# Altium footprint library Amirreza.PcbLib: 524 footprints (part 21 of 33)
Each footprint in its own frame and in the unit in brackets; x right, y up, seen from the top. Pads: shape width x height; smd on the part's side, far side on the other; paste and mask are expansions set on the pad; w line width, h text height; cw(c..) or ccw(c..) is an arc to the next point about the centre after c.
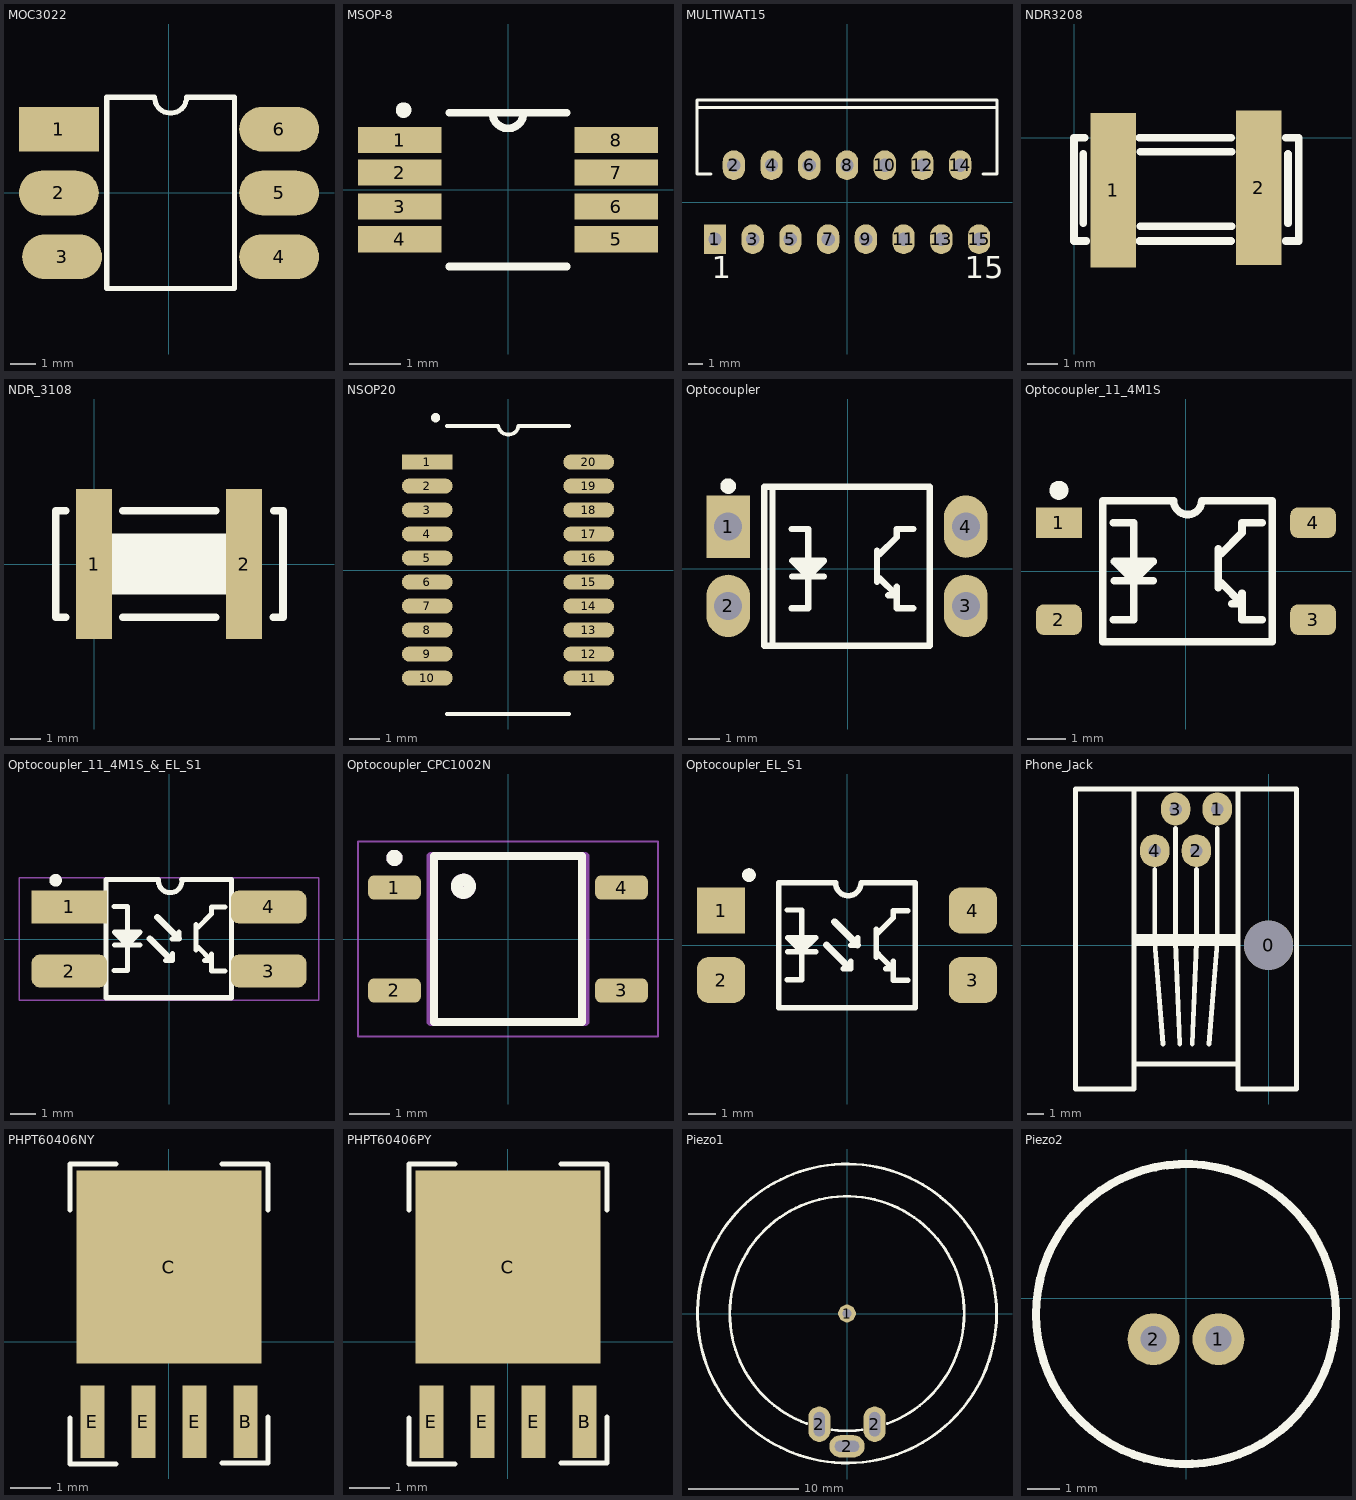
[diagram p20: the footprints below, top view; thin cyan lines are the x and y axes]

## MOC3022 [mil] "OPTO"
pads (6):
  rect 125x70 smd: 1(-172.5,100)
  oval 125x70 smd: 2(-172.5,0) 3(-167.5,-100) 4(172.5,-100) 5(172.52,0) 6(172.52,100)
Top Overlay:
  lines w7.87: -97.5,-150 102.5,-150 102.5,150 27.5,150 cw(c2.5,150) -22.5,150 -97.5,150 -97.5,-150
3D body "User Library-MOC8050SR2M.STEP": height 200, standoff -1.51, extent -194.95,-175 194.97,175

## MSOP-8 [mil]
pads (8):
  rect 64x20 smd: 1(-83,38) 2(-83,13) 3(-83,-13) 4(-83,-38) 5(83,-38) 6(83,-13) 7(83,13) 8(83,38)
Top Overlay:
  circle w10: c-80,61 r1
  lines w6: -45,-59 45,-59 ; -45,59 -12,59 ; 45,59 12,59 ; -12,59 ccw(c0,59) 12,59 ; -12,59 12,59
3D body "User Library-MSOP8.step": height 42.87, standoff -0.43, extent -97,-61.05 97.39,61

## MULTIWAT15 [mm] "TO, Thru-Hole, Vertical, Heatsink Mounted; 15 Bent Staggered Leads; Pitch 1.27 mm"
height 21
pads (15):
  rect 1.5x2 hole 0.9: 1(-8.89,-2.49)
  oval 1.5x2 hole 0.9: 2(-7.62,2.49) 3(-6.35,-2.49) 4(-5.08,2.49) 5(-3.81,-2.49) 6(-2.54,2.49) 7(-1.27,-2.49) 8(0,2.49) 9(1.27,-2.49) 10(2.54,2.49) 11(3.81,-2.49) 12(5.08,2.49) 13(6.35,-2.49) 14(7.62,2.49) 15(8.89,-2.49)
Top Overlay:
  lines w0.2: -10.1,6.39 10.1,6.39 ; -9.144,1.89 -10.1,1.89 -10.1,6.89 10.1,6.89 10.1,1.89 9.144,1.89
  text "15" at 7.94,-5.115 h1.5
  text "1" at -9.12,-5.115 h1.5

## NDR3208 [mm]
pads (2):
  rect 1.5x5.1 smd: 1(1.295,-1.727) 2(6.096,-1.651)
Top Overlay:
  lines w0.254: 0.305,-2.819 0.305,-0.533 ; 0.356,0 0,0 0,-3.404 0.406,-3.404 ; 2.159,-3.404 5.182,-3.404 ; 2.159,0 5.182,0 ; 2.184,-2.921 5.207,-2.921 ; 2.184,-0.457 5.207,-0.457 ; 6.985,-3.404 7.417,-3.404 7.417,0 6.985,0 ; 7.061,-2.819 7.061,-0.533

## NDR_3108 [mm]
pads (2):
  rect 1.2x5 smd: 1(0,0) 2(5,0)
Top Overlay:
  rectangle: -0.254,-1.016 5.334,1.016
  lines w0.254: -0.94,-1.778 -1.27,-1.778 -1.27,1.778 -0.94,1.778 ; 0.965,-1.778 4.064,-1.778 ; 0.965,1.778 4.064,1.778 ; 5.969,-1.778 6.299,-1.778 6.299,1.778 5.994,1.778

## NSOP20 [mm]
pads (20):
  rect 1.7x0.5 smd: 1(-2.692,3.6)
  oval 1.7x0.5 smd: 2(-2.692,2.8) 3(-2.692,2) 4(-2.692,1.2) 5(-2.692,0.4) 6(-2.692,-0.4) 7(-2.692,-1.2) 8(-2.692,-2) 9(-2.692,-2.8) 10(-2.692,-3.6) 11(2.692,-3.6) 12(2.692,-2.8) 13(2.692,-2) 14(2.692,-1.2) 15(2.692,-0.4) 16(2.692,0.4) 17(2.692,1.2) 18(2.692,2) 19(2.692,2.8) 20(2.692,3.6)
Top Overlay:
  circle w0.254: c-2.413,5.08 r0.025
  lines w0.127: -2.032,-4.8 2.032,-4.8 ; -2.032,4.8 -0.327,4.8 ccw(c0.012,4.859) 0.351,4.8 2.032,4.8
3D body "User Library-HOLTEK_HT66F019-1.step": height 1.65, standoff -0.01, extent -3.01,-4.799 2.989,4.796

## Optocoupler [mm]
pads (4):
  rect 1.4x2 hole 0.9: 1(-3.835,1.346)
  oval 1.4x2 hole 0.9: 2(-3.835,-1.194) 3(3.785,-1.194) 4(3.785,1.346)
Top Overlay:
  circle w0.25: c-3.835,2.646 r0.125
  region: -1.143,-0.254 -1.143,0.254 -1.397,0.254 -1.397,-0.254
  rectangle: -1.575,0 -0.94,0.254
  lines w0.2: -2.413,-2.413 -2.413,2.54 ; -1.803,-1.27 -1.27,-1.27 -1.27,-0.254 ; -1.803,1.27 -1.27,1.27 -1.27,0.254 ; -1.778,-0.254 -0.762,-0.254 ; 0.94,-0.432 0.94,0.584 ; 1.016,-0.305 1.566,-0.855 ; 1.016,0.457 1.566,1.008 1.566,1.27 2.1,1.27 ; 1.295,-0.855 1.566,-0.855 ; 1.566,-0.584 1.566,-0.855 ; 2.1,-1.27 1.566,-1.27 1.566,-0.855 ; -1.27,-0.254 -0.762,0.254 -1.778,0.254 -1.27,-0.254 ; -2.675,-2.474 -2.675,2.626 -0.66,2.626 2.625,2.626 2.625,-2.474 -2.675,-2.474

## Optocoupler_11_4M1S [mm]
pads (4):
  rect 1.2x0.8 smd: 1(-3.333,1.27)
  rrect50% 1.2x0.8 smd: 2(-3.333,-1.27) 3(3.333,-1.27) 4(3.333,1.27)
Top Overlay:
  circle w0.25: c-3.333,2.12 r0.125
  region: -1.242,-0.254 -1.242,0.254 -1.496,0.254 -1.496,-0.254
  rectangle: -1.674,0 -1.039,0.254
  lines w0.2: -1.901,-1.27 -1.368,-1.27 -1.368,-0.254 ; -1.901,1.27 -1.368,1.27 -1.368,0.254 ; -1.876,-0.254 -0.86,-0.254 ; 0.842,-0.432 0.842,0.584 ; 0.918,-0.305 1.469,-0.855 ; 0.918,0.457 1.469,1.008 1.469,1.27 2.002,1.27 ; 1.198,-0.855 1.469,-0.855 ; 1.469,-0.584 1.469,-0.855 ; 2.002,-1.27 1.469,-1.27 1.469,-0.855 ; -1.368,-0.254 -0.86,0.254 -1.876,0.254 -1.368,-0.254 ; -2.18,-1.85 -2.18,1.85 -0.323,1.85 ccw(c0.044,1.85) 0.41,1.85 2.265,1.85 2.265,-1.85 -2.18,-1.85
3D body "User Library-4 Lead 6 SOIC.step": height 2.3, standoff 0, extent -3.171,-1.85 3.172,1.85

## Optocoupler_11_4M1S_&_EL_S1 [mm]
pads (4):
  rect 3x1.3 smd: 1(-3.95,1.27)
  rrect50% 3x1.3 smd: 2(-3.95,-1.27) 3(3.95,-1.27) 4(3.95,1.27)
Top Overlay:
  circle w0.25: c-4.5,2.33 r0.125
  region: -1.528,-0.235 -1.528,0.273 -1.782,0.273 -1.782,-0.235
  rectangle: -1.96,0.019 -1.325,0.273
  lines w0.2: -2.189,-1.251 -1.655,-1.251 -1.655,-0.235 ; -2.189,1.289 -1.655,1.289 -1.655,0.273 ; -2.163,-0.235 -1.147,-0.235 ; -0.417,2.348 ccw(c0.047,2.302) 0.51,2.346 ; -0.411,2.369 -2.493,2.369 -2.493,-2.331 2.485,-2.331 2.485,2.369 0.504,2.369 ; -0.131,-0.855 0.14,-0.855 0.14,-0.584 ; 0.129,0.002 0.4,0.002 0.4,0.273 ; 1.063,-0.438 1.063,0.578 ; 1.139,-0.311 1.689,-0.862 ; 1.139,0.451 1.689,1.001 1.689,1.263 2.223,1.263 ; 1.418,-0.862 1.689,-0.862 ; 1.689,-0.591 1.689,-0.862 ; 2.223,-1.277 1.689,-1.277 1.689,-0.862 ; -1.655,-0.235 -1.147,0.273 -2.163,0.273 -1.655,-0.235
  lines w0.254: -0.757,0.016 0.072,-0.813 ; -0.458,0.86 0.383,0.019
Mechanical 13:
  lines w0.05: -5.95,-2.42 -5.95,2.42 5.95,2.42 5.95,-2.42 -5.95,-2.42
3D body "User Library-PC817_Gullwing.STEP": height 3.85, standoff 0, extent -5,-2.29 5,2.29

## Optocoupler_CPC1002N [mm]
pads (4):
  rrect50% 1.3x0.6 smd: 1(-2.8,1.27) 2(-2.8,-1.27) 3(2.8,-1.27) 4(2.8,1.27)
Top Overlay:
  circle w0.3: c-1.1,1.3 r0.16
  circle w0.2: c-2.8,2 r0.1
  lines w0.2: -1.825,-2.05 1.825,-2.05 1.825,2.05 -1.825,2.05 -1.825,-2.05
Mechanical 13:
  circle w0.3: c-1.1,1.3 r0.16
  circle w0.2: c-2.8,2 r0.1
  lines w0.2: -1.905,-2.05 1.905,-2.05 1.905,2.05 -1.905,2.05 -1.905,-2.05
Mechanical 15:
  lines w0.05: -3.7,-2.4 3.7,-2.4 3.7,2.4 -3.7,2.4 -3.7,-2.4

## Optocoupler_EL_S1 [mm]
pads (4):
  rect 1.76x1.68 smd: 1(-4.6,1.27)
  rrect50% 1.76x1.68 smd: 2(-4.6,-1.27) 3(4.6,-1.27) 4(4.6,1.27)
Top Overlay:
  circle w0.25: c-3.581,2.565 r0.125
  region: -1.528,-0.235 -1.528,0.273 -1.782,0.273 -1.782,-0.235
  rectangle: -1.96,0.019 -1.325,0.273
  lines w0.2: -2.189,-1.251 -1.655,-1.251 -1.655,-0.235 ; -2.189,1.289 -1.655,1.289 -1.655,0.273 ; -2.163,-0.235 -1.147,-0.235 ; -0.131,-0.855 0.14,-0.855 0.14,-0.584 ; 0.129,0.002 0.4,0.002 0.4,0.273 ; 1.063,-0.438 1.063,0.578 ; 1.139,-0.311 1.689,-0.862 ; 1.139,0.451 1.689,1.001 1.689,1.263 2.223,1.263 ; 1.418,-0.862 1.689,-0.862 ; 1.689,-0.591 1.689,-0.862 ; 2.223,-1.277 1.689,-1.277 1.689,-0.862 ; -1.655,-0.235 -1.147,0.273 -2.163,0.273 -1.655,-0.235 ; -2.493,-2.286 -2.493,2.28 -0.419,2.28 ccw(c0.047,2.28) 0.512,2.28 2.485,2.28 2.485,-2.286 -2.493,-2.286
  lines w0.254: -0.757,0.016 0.072,-0.813 ; -0.458,0.86 0.383,0.019
3D body "User Library-PC817_Gullwing.STEP": height 3.85, standoff 0, extent -5,-2.29 5,2.29

## Phone_Jack [mm]
pads (5):
  round 3 hole 3: 0(0,0)
  oval 1.8x2 hole 0.762: 1(-3.131,8.303) 2(-4.401,5.763) 3(-5.671,8.303) 4(-6.941,5.763)
Top Overlay:
  lines w0.3: -8.211,0.352 -1.912,0.352 ; -8.211,0.53 -2.242,0.53 -1.861,0.53 ; -8.211,1.445 -8.211,0.124 -8.186,0.098 -1.861,0.098 ; -8.211,9.522 -8.211,-7.242 ; -7.297,-7.242 -1.861,-7.242 ; -6.941,0.175 -6.433,-6.023 ; -6.941,0.505 -6.941,2.207 ; -6.941,1.495 -6.941,4.62 ; -5.697,0.352 -5.671,0.378 ; -5.671,0.175 -5.417,-6.023 ; -5.671,0.403 -5.671,2.08 ; -5.671,1.013 -5.671,7.109 ; -4.655,-6.023 -4.401,0.175 -4.401,2.232 ; -4.401,1.495 -4.401,4.62 ; -3.639,-6.023 -3.131,0.175 ; -3.131,0.403 -3.131,2.08 ; -3.131,1.013 -3.131,7.109 ; -2.776,-7.242 -8.211,-7.242 ; -1.861,-1.502 -1.861,-1.07 ; -1.861,9.522 -1.861,-7.242 ; -8.211,-7.242 -8.211,-8.766 -11.767,-8.766 -11.767,9.522 1.695,9.522 1.695,-8.766 -1.861,-8.766 -1.861,-7.242

## PHPT60406NY [mm]
pads (5):
  rect 0.6x1.8 smd: B(1.905,-2) E(-1.905,-2) E(-0.635,-2) E(0.635,-2)
  rect 4.6x4.8 smd: C(0,1.855)
Top Overlay:
  lines w0.127: -2.464,-1.905 -2.464,-3.048 -1.321,-3.048 ; -2.464,3.277 -2.464,4.42 -1.321,4.42 ; 1.321,-3.023 2.464,-3.023 2.464,-1.88 ; 1.321,4.42 2.464,4.42 2.464,3.277
3D body "User Library-SOT669-CW.step": height 1.2, standoff 0, extent -2.45,-2.54 2.45,3.888

## PHPT60406PY [mm]
pads (5):
  rect 0.6x1.8 smd: B(1.905,-2) E(-1.905,-2) E(-0.635,-2) E(0.635,-2)
  rect 4.6x4.8 smd: C(0,1.855)
Top Overlay:
  lines w0.127: -2.464,-1.905 -2.464,-3.048 -1.321,-3.048 ; -2.464,3.277 -2.464,4.42 -1.321,4.42 ; 1.321,-3.023 2.464,-3.023 2.464,-1.88 ; 1.321,4.42 2.464,4.42 2.464,3.277
3D body "User Library-SOT669-CW.step": height 1.2, standoff 0, extent -2.45,-2.54 2.45,3.888

## Piezo1 [mm]
pads (4):
  round 1.6 hole 0.8: 1(0,0)
  oval 2x3.2 hole 2.2 slot 1 at 0 deg: 2(-2.5,-10) 2(2.5,-10)
  oval 3.2x2 hole 2.2 slot 1 at 90 deg: 2(0,-12)
Top Overlay:
  circle w0.254: c0,0 r13.513
  lines w0.254: -3.63,-9.954 cw(c0,0) 3.637,-9.951 ; -1.363,-10.508 ccw(c0.001,0.11) 1.365,-10.509

## Piezo2 [mm]
pads (2):
  round 1.6 hole 0.8: 1(0.991,-1.27) 2(-1.009,-1.27)
Top Overlay:
  lines w0.254: 4.613,-0.493 cw(c-0.009,-0.493) 4.613,-0.467